# Altium footprint library BARKO_PCBLIB.PcbLib: 531 footprints (part 25 of 34)
Each footprint in its own frame and in the unit in brackets; x right, y up, seen from the top. Pads: shape width x height; smd on the part's side, far side on the other; paste and mask are expansions set on the pad; w line width, h text height; cw(c..) or ccw(c..) is an arc to the next point about the centre after c.
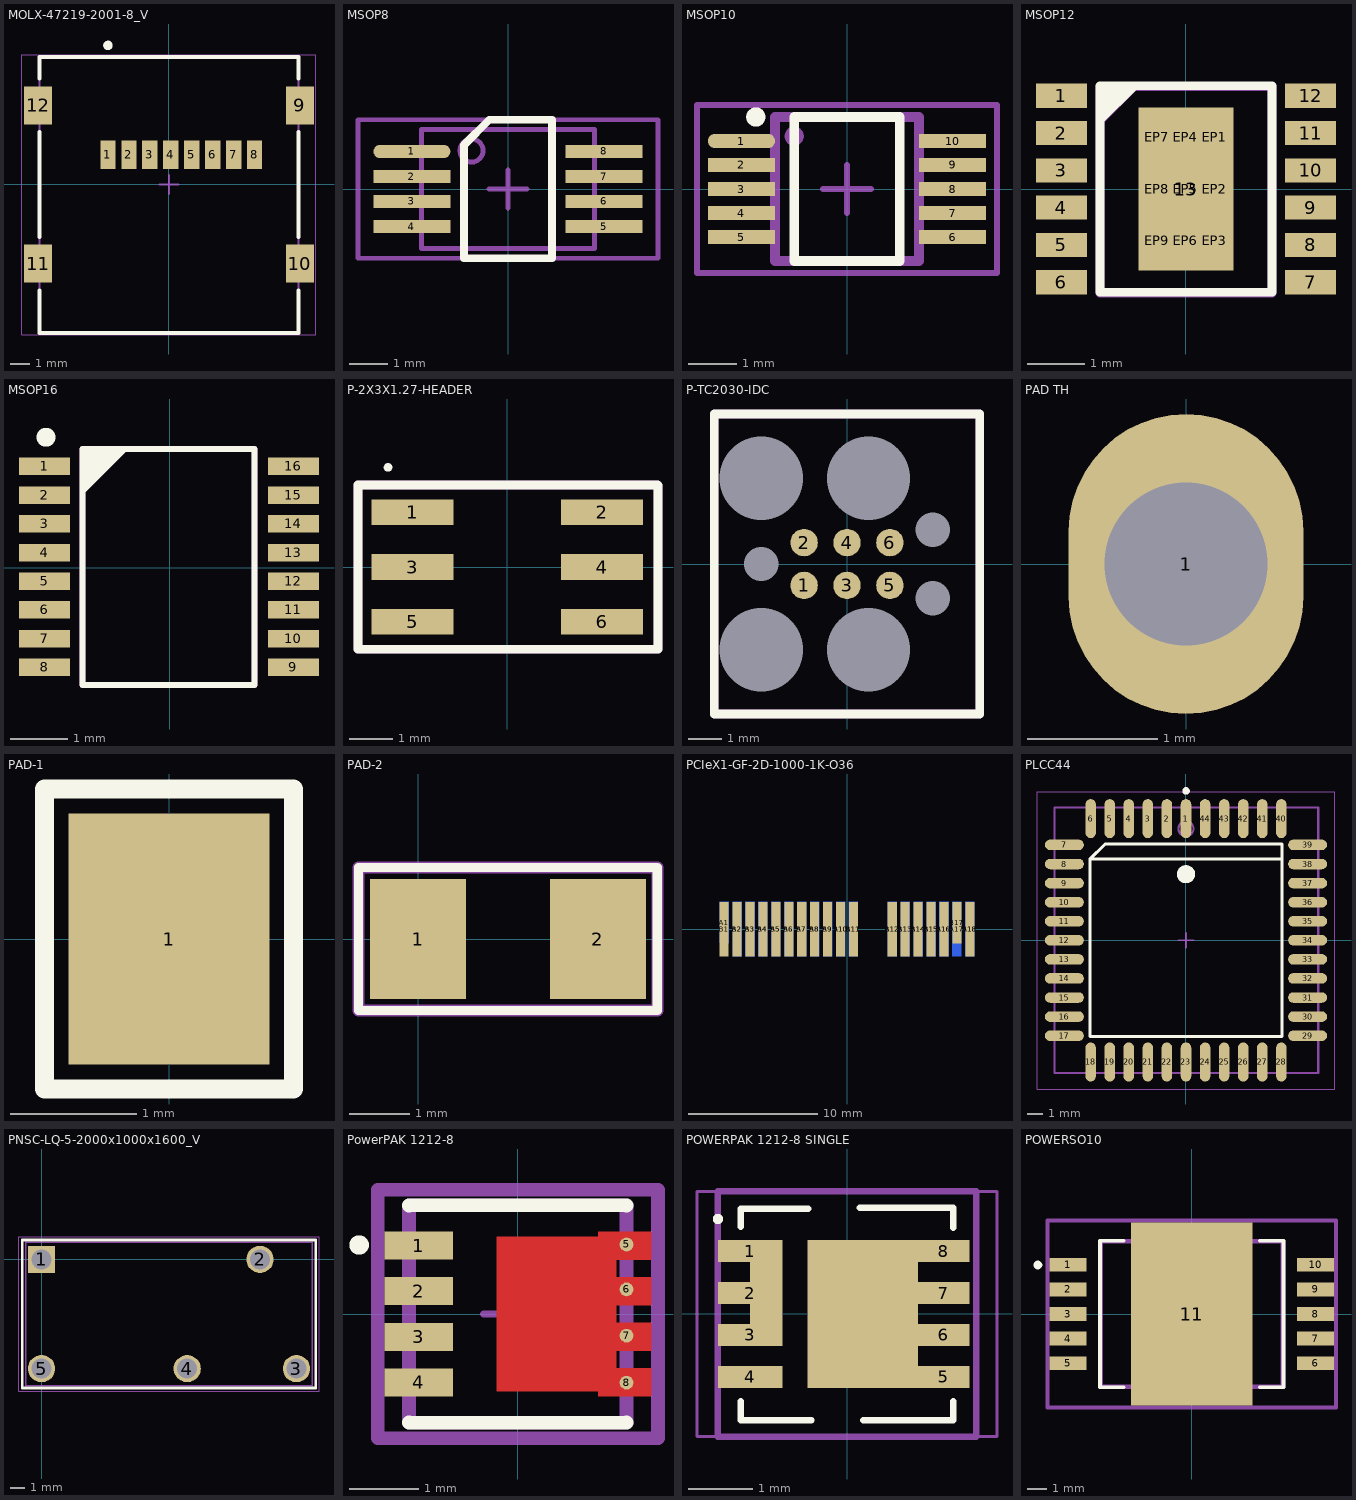
[diagram p24: the footprints below, top view; thin cyan lines are the x and y axes]

## MOLX-47219-2001-8_V [mm] "CONN, 8-Leads, Body 14.5x13.6mm, Pitch 1.1mm"
height 1.9
pads (12):
  rect 0.8x1.5 smd: 1(-3.205,1.55) 2(-2.105,1.55) 3(-1.005,1.55) 4(0.095,1.55) 5(1.195,1.55) 6(2.295,1.55) 7(3.395,1.55) 8(4.495,1.55)
  rect 1.45x2 smd: 9(6.875,4.15) 10(6.875,-4.15) 11(-6.875,-4.15) 12(-6.875,4.15)
Top Overlay:
  circle w0.25: c-3.205,7.3 r0.125
  lines w0.2: -6.8,-5.55 -6.8,-7.8 6.8,-7.8 6.8,-5.55 ; -6.8,-2.75 -6.8,2.75 ; -6.8,5.55 -6.8,6.7 6.8,6.7 6.8,5.55 ; 6.8,-2.75 6.8,2.75
Mechanical 15:
  lines w0.05: -7.725,-7.9 -7.725,6.8 7.7,6.8 7.7,-7.9 -7.725,-7.9
  lines w0.1: -0.5,0 0.5,0 ; 0,-0.5 0,0.5
ASM Top:
  lines w0.1: -6.8,-7.8 -6.8,6.7 6.8,6.7 6.8,-7.8 -6.8,-7.8
  text ".designator" at -0.584,-0.051 h0.8
3D body "472192001.stp": height 1.91, standoff 0.02, extent -7.3,-7.793 7.3,6.707

## MSOP8 [mm] "TSOP, 8-Leads, Body 3,00x3,00mm, Pitch 0,65mm, IPC Medium Density"
height 1.1
pads (8):
  oval 2x0.35 smd mask+0.05: 1(-2.5,0.975)
  rect 2x0.35 smd mask+0.05: 2(-2.5,0.325) 3(-2.5,-0.325) 4(-2.5,-0.975) 5(2.5,-0.975) 6(2.5,-0.325) 7(2.5,0.325) 8(2.5,0.975)
Top Overlay:
  lines w0.2: -1.143,-1.8 -1.143,1.143 -0.486,1.8 1.143,1.8 1.143,-1.8 -1.143,-1.8
Mechanical 15:
  lines w0.127: -0.5,0 0.5,0 ; 0,-0.5 0,0.5 ; -3.9,-1.8 3.9,-1.8 3.9,1.8 -3.9,1.8 -3.9,-1.8
ASM Top:
  circle w0.127: c-0.95,1 r0.3
  lines w0.127: -1.55,-1.55 1.55,-1.55 ; -1.55,1.55 1.55,1.55 ; -2.25,-1.55 -2.25,1.55 2.25,1.55 2.25,-1.55 -2.25,-1.55
3D body "TSSOP8.step": height 1.2, standoff 0, extent -3.2,-1.55 3.2,1.55

## MSOP10 [mm] "TSSOP, 10-Leads, Body 3,00x3,00mm, Pitch 0,50mm, IPC Medium Density"
height 1.1
pads (10):
  oval 1.4x0.3 smd mask+0.05: 1(-2.2,1)
  rect 1.4x0.3 smd mask+0.05: 2(-2.2,0.5) 3(-2.2,0) 4(-2.2,-0.5) 5(-2.2,-1) 6(2.2,-1) 7(2.2,-0.5) 8(2.2,0) 9(2.2,0.5) 10(2.2,1)
Top Overlay:
  circle w0.2: c-1.9,1.5 r0.1
  lines w0.2: -1.1,-1.5 1.1,-1.5 1.1,1.5 -1.1,1.5 -1.1,-1.5
Mechanical 15:
  lines w0.127: -0.5,0 0.5,0 ; 0,-0.5 0,0.5 ; -3.125,-1.75 3.125,-1.75 3.125,1.75 -3.125,1.75 -3.125,-1.75
ASM Top:
  circle w0.2: c-1.1,1.1 r0.1
  lines w0.2: -1.5,-1.5 -1.5,1.5 1.5,1.5 1.5,-1.5 -1.5,-1.5
  text ".designator" at 0,0 h0.8
3D body "MSOP10.step": height 1.1, standoff 0, extent -2.45,-1.5 2.45,1.5

## MSOP12 [mm]
pads (22):
  rect 0.889x0.42 smd mask+0.05: 1(-2.17,1.625) 2(-2.17,0.975) 3(-2.17,0.325) 4(-2.17,-0.325) 5(-2.17,-0.975) 6(-2.17,-1.625) 7(2.171,-1.625) 8(2.171,-0.975) 9(2.171,-0.325) 10(2.171,0.325) 11(2.171,0.975) 12(2.171,1.625)
  rect 1.651x2.845 smd paste-100 mask+0.05: 13(0,0)
  rect 0.3x0.6 on Top Paste mask+0.102: EP1(0.5,0.9) EP2(0.5,0) EP3(0.5,-0.9) EP4(0,0.9) EP5(0,0) EP6(0,-0.9) EP7(-0.5,0.9) EP8(-0.5,0) EP9(-0.5,-0.9)
Top Overlay:
  region: -1.5,1.1 -0.814,1.786 -1.5,1.8
  lines w0.152: -1.5,-1.8 1.5,-1.8 1.5,1.8 -1.5,1.8 -1.5,-1.8
ASM Top:
  region: -1.5,1.085 -0.814,1.771 -1.5,1.785
  lines w0.152: -1.5,-1.815 -1.5,1.785 1.5,1.785 1.5,-1.815 -1.5,-1.815
  text ".designator" at -0.15,-0.076 h0.8
3D body "msop-12.STEP": height 1.1, standoff 0, extent -2.4,-2.02 2.5,2.02

## MSOP16 [mm]
pads (16):
  rect 0.889x0.305 smd mask+0.051: 1(-2.182,1.767) 2(-2.182,1.267) 3(-2.182,0.767) 4(-2.182,0.267) 5(-2.182,-0.233) 6(-2.182,-0.733) 7(-2.182,-1.233) 8(-2.182,-1.733) 9(2.157,-1.733) 10(2.157,-1.233) 11(2.157,-0.733) 12(2.157,-0.233) 13(2.157,0.267) 14(2.157,0.767) 15(2.157,1.267) 16(2.157,1.767)
Top Overlay:
  circle w0.254: c-2.156,2.275 r0.036
  region: -1.521,1.267 -1.521,2.072 -0.717,2.072
  lines w0.102: -1.521,-2.043 -1.521,2.072 1.476,2.072 1.476,-2.043 -1.521,-2.043
ASM Top:
  lines w0.102: -1.521,-2.043 -1.521,2.072 1.476,2.072 1.476,-2.043 -1.521,-2.043
  text ".designator" at -0.963,-0.233 h0.8
3D body "MSOP-16.STEP": height 0.87, standoff 0.01, extent -2.447,-2.005 2.453,2.034

## P-2X3X1.27-HEADER [mm]
pads (6):
  rect 1.9x0.6 smd paste-0.05: 1(-2.2,1.27)
  rect 1.9x0.6 smd: 2(2.2,1.27) 3(-2.2,0) 4(2.2,0) 5(-2.2,-1.27) 6(2.2,-1.27)
Top Overlay:
  circle w0.1: c-2.769,2.311 r0.05
  lines w0.2: 3.496,1.894 3.485,1.905 -2.926,1.905 -3.465,1.905 -3.465,-1.905 3.496,-1.905 3.496,1.894 ; 3.496,1.894 3.496,1.894
ASM Top:
  lines w0.2: -3.465,-1.905 3.496,-1.905 3.496,1.894 3.485,1.905 -3.465,1.905 -3.465,-1.905
  text ".designator" at -0.005,0 h0.8
3D body "FTSH-103-01-L-DV-TR.stp": height 5.98, standoff 0.01, extent -2.926,-1.905 2.916,1.905

## P-TC2030-IDC [mil]
pads (13):
  round 32 smd paste-50 mask+0: 1(-50,-25) 2(-50,25) 3(0,-25) 4(0,25) 5(50,-25) 6(50,25)
  round 1 hole 97 unplated mask+4: MP1(-100,100) MP2(25,100) MP3(-100,-100) MP4(25,-100)
  round 1 hole 40 unplated mask+4: MP5(-100,0) MP6(100,40) MP7(100,-40)
Top Overlay:
  lines w10: -155,-175 -155,175 155,175 155,-175 -155,-175
ASM Top:
  lines w10: -155,-175 155,-175 155,175 -155,175 -155,-175
  text ".designator" at -64,-28 h31.5

## PAD TH [mm] "1.25mm Hole"
pads (1):
  oval 1.8x2.3 hole 1.25: 1(0,0)

## PAD-1 [mm]
pads (1):
  rect 1.6x2 smd: 1(0,0)
Top Overlay:
  lines w0.152: -0.991,-1.194 -0.991,1.194 0.991,1.194 0.991,-1.194 -0.991,-1.194

## PAD-2 [mm]
pads (2):
  rect 1.6x2 smd paste-0.05 mask+0.05: 1(0,0) 2(3,0)
Top Overlay:
  lines w0.152: -0.991,-1.194 -0.991,1.194 3.988,1.194 3.988,-1.194 -0.991,-1.194
ASM Top:
  lines w0.2: -0.991,-1.194 -0.991,1.194 3.988,1.194 3.988,-1.194 -0.991,-1.194
  text ".designator" at 0.7,-0.2 h0.8
3D body: height 0.65, standoff 0, extent 0.256,-0.95 2.745,0.95
3D body: height 0.65, standoff 0, extent 2.745,-0.95 3.456,0.95
3D body: height 0.65, standoff 0, extent -0.455,-0.95 0.256,0.95

## PCIeX1-GF-2D-1000-1K-O36 [mm] "Golden finger, PCIeX1, Dual, Opposite, Pitch 1mm, 36-Position"
pads (36):
  rect 0.7x3.2 smd far side paste-1: A1(-9.5,0.5)
  rect 0.7x4.2 smd far side paste-1: A2(-8.5,0) A3(-7.5,0) A4(-6.5,0) A5(-5.5,0) A6(-4.5,0) A7(-3.5,0) A8(-2.5,0) A9(-1.5,0) A10(-0.5,0) A11(0.5,0) A12(3.5,0) A13(4.5,0) A14(5.5,0) A15(6.5,0) A16(7.5,0) A17(8.5,0) A18(9.5,0)
  rect 0.7x4.2 smd paste-1: B1(-9.5,0) B2(-8.5,0) B3(-7.5,0) B4(-6.5,0) B5(-5.5,0) B6(-4.5,0) B7(-3.5,0) B8(-2.5,0) B9(-1.5,0) B10(-0.5,0) B11(0.5,0) B12(3.5,0) B13(4.5,0) B14(5.5,0) B15(6.5,0) B16(7.5,0) B18(9.5,0)
  rect 0.7x3.2 smd paste-1: B17(8.5,0.5)
Top Solder:
  rectangle: -10.4,-3.75 10.4,2.225
Bottom Solder:
  rectangle: -10.4,-3.75 10.4,2.225

## PLCC44 [mm] "Leaded Chip Carrier, 44-Leads, Body 16.6x16.6mm, Pitch 1.27mm, IPC Low Density"
height 4.58
pads (44):
  oval 0.7x2.6 smd: 1(0,8.1) 2(-1.27,8.1) 3(-2.54,8.1) 4(-3.81,8.1) 5(-5.08,8.1) 6(-6.35,8.1) 18(-6.35,-8.1) 19(-5.08,-8.1) 20(-3.81,-8.1) 21(-2.54,-8.1) 22(-1.27,-8.1) 23(0,-8.1) 24(1.27,-8.1) 25(2.54,-8.1) 26(3.81,-8.1) 27(5.08,-8.1) 28(6.35,-8.1) 40(6.35,8.1) 41(5.08,8.1) 42(3.81,8.1) 43(2.54,8.1) 44(1.27,8.1)
  oval 2.6x0.7 smd: 7(-8.1,6.35) 8(-8.1,5.08) 9(-8.1,3.81) 10(-8.1,2.54) 11(-8.1,1.27) 12(-8.1,0) 13(-8.1,-1.27) 14(-8.1,-2.54) 15(-8.1,-3.81) 16(-8.1,-5.08) 17(-8.1,-6.35) 29(8.1,-6.35) 30(8.1,-5.08) 31(8.1,-3.81) 32(8.1,-2.54) 33(8.1,-1.27) 34(8.1,0) 35(8.1,1.27) 36(8.1,2.54) 37(8.1,3.81) 38(8.1,5.08) 39(8.1,6.35)
Top Overlay:
  circle w0.6: c0,4.4 r0.3
  circle w0.25: c0,9.95 r0.125
  lines w0.2: 6.4,5.4 -6.4,5.4 ; -6.4,5.4 -6.4,-6.4 6.4,-6.4 6.4,6.4 -5.4,6.4 -6.4,5.4
Mechanical 15:
  lines w0.05: -9.9,-9.9 9.9,-9.9 9.9,9.9 -9.9,9.9 -9.9,-9.9
  lines w0.1: -0.5,0 0.5,0 ; 0,-0.5 0,0.5
ASM Top:
  circle w0.15: c0,7.43 r0.5
  lines w0.15: -8.763,-8.839 -8.763,8.839 8.814,8.839 8.814,-8.839 -8.763,-8.839
  text ".designator" at -0.388,0 h0.8
3D body "User Library-PLCC44-1.step": height 4.3, standoff -0.04, extent -8.8,-8.8 8.8,8.8

## PNSC-LQ-5-2000x1000x1600_V [mm] "LQ, 5-Leads, Body 20x10mm"
height 16.6
pads (5):
  rect 1.9x1.9 hole 1.4: 1(0,0)
  round 1.9 hole 1.4: 2(15.24,0) 3(17.78,-7.62) 4(10.16,-7.62) 5(0,-7.62)
Top Overlay:
  lines w0.2: -1.35,-8.97 -1.35,1.35 19.13,1.35 19.13,-8.97 -1.35,-8.97
Mechanical 15:
  lines w0.05: -1.575,-9.195 -1.575,1.575 19.355,1.575 19.355,-9.195 -1.575,-9.195
ASM Top:
  lines w0.1: -1.11,-8.81 -1.11,1.19 18.89,1.19 18.89,-8.81 -1.11,-8.81
  text ".designator" at 8.18,-3.77 h0.8
3D body: height 16.6, standoff 0.6, extent -1.11,-8.81 18.89,1.19

## PowerPAK 1212-8 [mil]
pads (8):
  rect 39x16 smd paste+0 mask+0: 1(-56.5,39) 2(-56.5,13) 3(-56.5,-13) 4(-56.5,-39)
  round 7.87 smd paste+0 mask+0: 5(62.01,39.64) 6(62.01,14.06) 7(62.01,-12.35) 8(62.01,-39.17)
Top Layer:
  region: -12,44 46,44 46,47 76,47 76,31 56,31 56,21 76,21 76,5 56,5 56,-5 76,-5 76,-21 56,-21 56,-31 76,-31 76,-47 46,-47 46,-44 -12,-44
Top Overlay:
  circle w9.84: c-90.55,39.37 r0.61
  lines w7.87: -62.01,-61.76 -62.01,-62.01 62.01,-62.01 62.01,-61.76 ; -62.01,61.76 -62.01,62.01 62.01,62.01 62.01,61.76
Mechanical 15:
  lines w3.94: -19.68,0 19.68,0 ; 0,-19.68 0,19.68
  lines w7.87: -79.94,-70.87 -79.94,70.87 79.94,70.87 79.94,-70.87 -79.94,-70.87
ASM Top:
  lines w7.87: -62.01,-62.01 62.01,-62.01 62.01,62.01 -62.01,62.01 -62.01,-62.01
  text ".Designator" at 0,0 h39.37
3D body "Trans_Vishay_SI7113ADN-T1-GE3_eec.STEP": height 46.14, standoff 0, extent -64.96,-64.96 64.96,64.96

## POWERPAK 1212-8 SINGLE [mm] "TO, 5-Pads, Body 4.63x5.01mm (max), IPC Medium Density"
height 1.04
pads (10):
  rect 1x0.34 smd mask+0.05: 1(-1.5,0.975) 2(-1.5,0.325) 4(-1.5,-0.975)
  rect 1x0.34 smd: 3(-1.5,-0.325)
  rect 0.8x0.34 smd mask+0.05: 5(1.5,-0.975) 6(1.5,-0.325) 7(1.5,0.325) 8(1.5,0.975)
  rect 0.5x1.64 smd mask+0.05: ""(-1.25,0.325)
  rect 1.71x2.29 smd mask+0.05: ""(0.245,0)
Top Overlay:
  circle w0.1: c-2,1.473 r0.03
  lines w0.1: -1.65,-1.35 -1.65,-1.65 -0.55,-1.65 ; -1.65,1.35 -1.65,1.634 -0.6,1.634 ; 0.2,1.65 1.645,1.65 1.645,1.334 ; 0.25,-1.65 1.65,-1.65 1.65,-1.35
Mechanical 15:
  lines w0.05: -2.325,-1.9 2.325,-1.9 2.325,1.9 -2.325,1.9 -2.325,-1.9
  lines w0.1: -0.5,0 0.5,0 ; 0,-0.5 0,0.5
ASM Top:
  lines w0.1: -2,-1.9 -2,1.9 2,1.9 2,-1.9 -2,-1.9
  text ".designator" at -0.3,-0.1 h0.8
3D body "User Library-PowerPAK 1212-8-SiS892DN.step": height 1.05, standoff 0.01, extent -1.65,-1.65 1.65,1.65

## POWERSO10 [mm]
pads (11):
  rect 1.925x0.7 smd paste-0.05 mask+0.05: 1(-6.412,2.54) 2(-6.412,1.27) 3(-6.412,0) 4(-6.412,-1.27) 5(-6.412,-2.54) 6(6.412,-2.54) 7(6.412,-1.27) 8(6.412,0) 9(6.412,1.27) 10(6.412,2.54)
  rect 6.3x9.5 smd paste-10 mask+0.05: 11(0,0)
Top Overlay:
  circle w0.25: c-7.975,2.54 r0.1
  lines w0.2: -3.525,-3.8 -4.75,-3.8 -4.75,3.8 -3.525,3.8 ; 3.525,-3.8 4.75,-3.8 4.75,3.8 3.525,3.8
Top Paste:
  rectangle: -3,-4.6 -1.2,-2.8
  region: 3,-2.8 1.2,-2.8 1.2,-4.6 3,-4.6
  region: 0.9,-2.8 -0.9,-2.8 -0.9,-4.6 0.9,-4.6
  rectangle: -3,-2.1 -1.2,-0.3
  region: 3,-0.3 1.2,-0.3 1.2,-2.1 3,-2.1
  region: 0.9,-0.3 -0.9,-0.3 -0.9,-2.1 0.9,-2.1
  rectangle: -3,0.4 -1.2,2.2
  region: 3,2.2 1.2,2.2 1.2,0.4 3,0.4
  region: 0.9,2.2 -0.9,2.2 -0.9,0.4 0.9,0.4
  region: 0.9,4.7 -0.9,4.7 -0.9,2.9 0.9,2.9
  region: 3,4.7 1.2,4.7 1.2,2.9 3,2.9
  rectangle: -3,2.9 -1.2,4.7
Mechanical 15:
  lines w0.2: -7.475,-4.85 -7.475,4.85 7.475,4.85 7.475,-4.85 -7.475,-4.85
Mechanical 16:
  lines w0.1: -0.5,0 0.5,0 ; 0,-0.5 0,0.5
ASM Top:
  lines w0.2: -4.75,-3.8 -4.75,3.8 4.75,3.8 4.75,-3.8 -4.75,-3.8 ; -4.7,-3.75 -4.7,3.75 4.7,3.75 4.7,-3.75 -4.7,-3.75
  text ".designator" at 0,0.188 h0.8
3D body "IC_STMicroelectronics_VN340SP-E_eec.STEP": height 3.7, standoff 0, extent -7.089,-4.75 7.089,4.75